# Altium footprint library Semi-ATE.PcbLib: 155 footprints (part 8 of 10)
Each footprint in its own frame and in the unit in brackets; x right, y up, seen from the top. Pads: shape width x height; smd on the part's side, far side on the other; paste and mask are expansions set on the pad; w line width, h text height; cw(c..) or ccw(c..) is an arc to the next point about the centre after c.
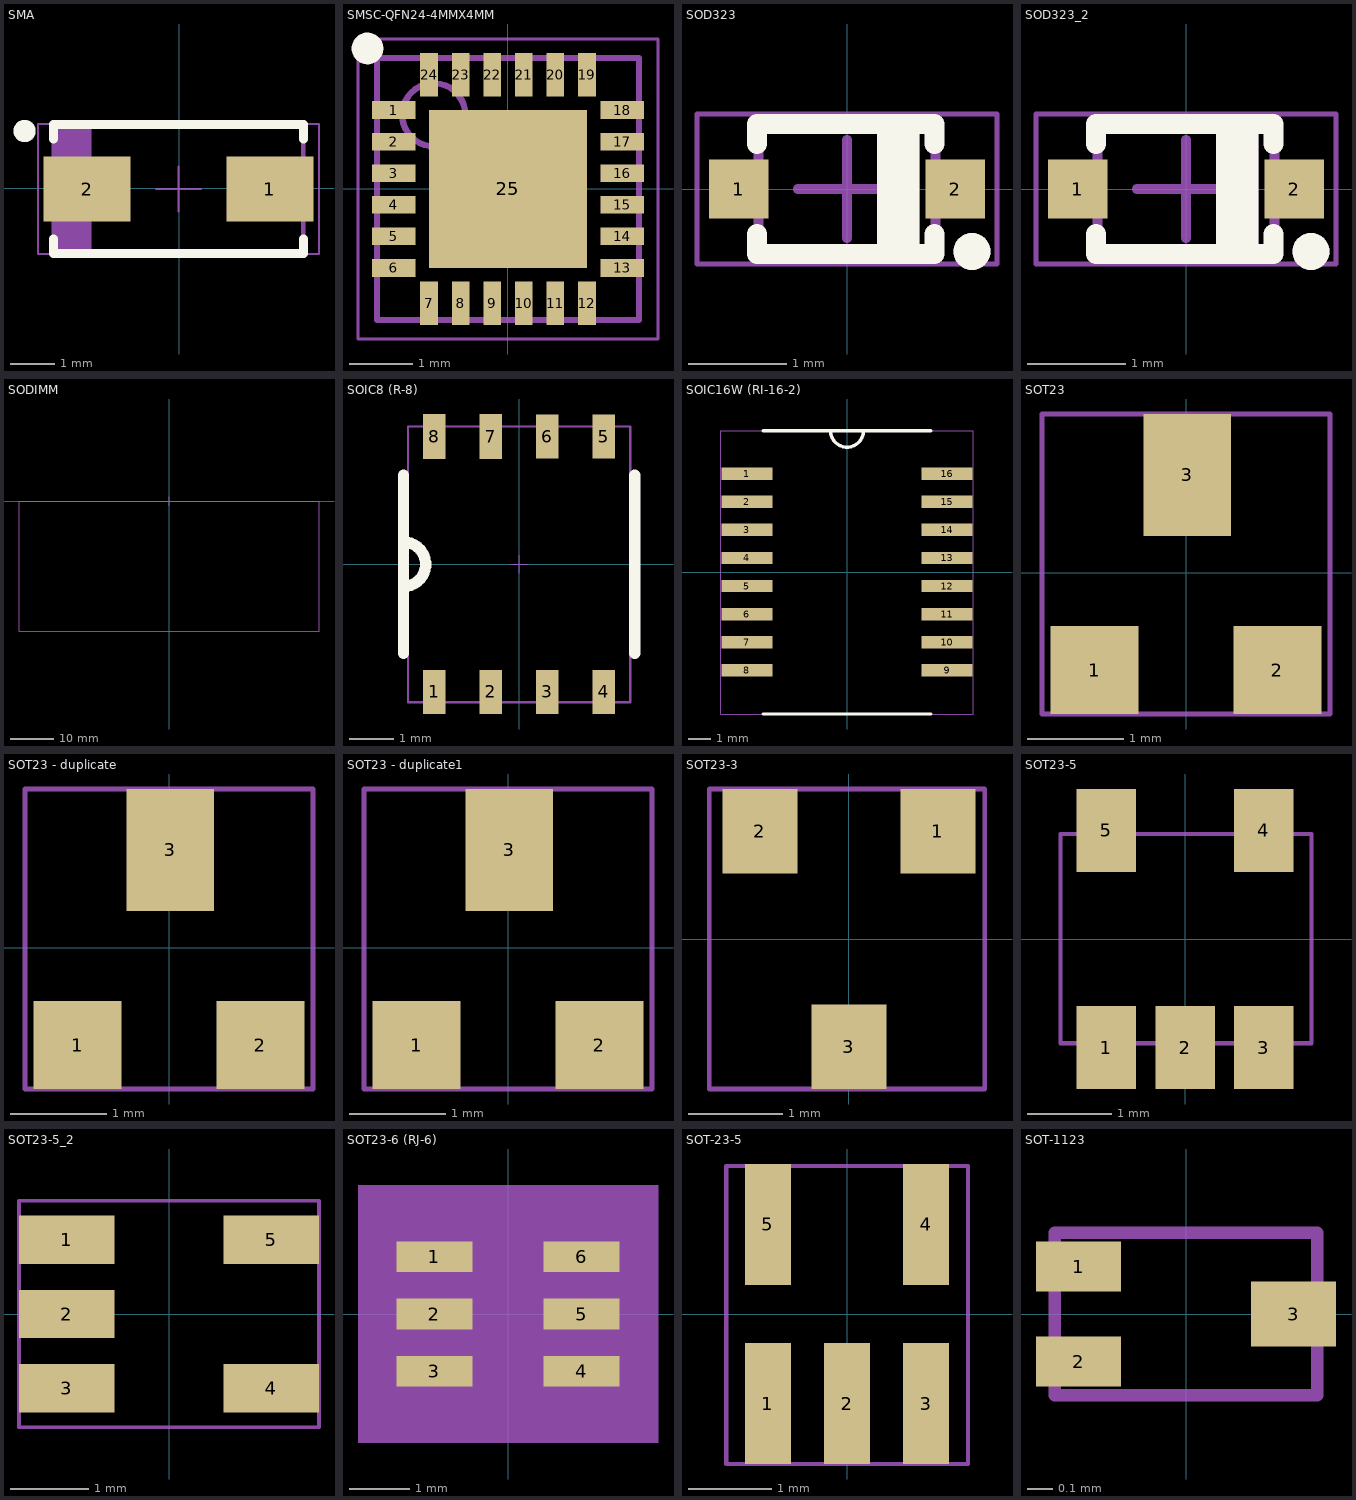
[diagram p7: the footprints below, top view; thin cyan lines are the x and y axes]

## SMA [mm]
height 2.62
pads (2):
  rect 1.95x1.45 smd: 1(2.037,-0.013) 2(-2.063,-0.013)
Top Overlay:
  circle w0.25: c-3.463,1.287 r0.125
  lines w0.2: -2.813,-1.138 -2.813,-1.463 2.787,-1.463 2.787,-1.138 ; -2.813,1.112 -2.813,1.437 2.787,1.437 2.787,1.112
Top Designator:
  text ".Designator" at -7.893,-0.521 h1.52
Top 3D Body:
  lines w0.05: -3.163,-1.473 -3.163,1.447 3.137,1.447 3.137,-1.473 -3.163,-1.473
Bottom 3D Body:
  lines w0.1: -2.708,-1.473 -2.708,1.447 ; -2.608,-1.473 -2.608,1.447 ; -2.508,-1.473 -2.508,1.447 ; -2.408,-1.473 -2.408,1.447 ; -2.308,-1.473 -2.308,1.447 ; -2.208,-1.473 -2.208,1.447 ; -2.108,-1.473 -2.108,1.447 ; -2.008,-1.473 -2.008,1.447 ; -2.808,-1.473 2.782,-1.473 2.782,1.447 -2.808,1.447 -2.808,-1.473
Bottom Gold Plating:
  lines w0.05: -0.513,-0.013 0.487,-0.013 ; -0.013,-0.513 -0.013,0.487
3D body: height 2.4, standoff 0, extent -2.808,-1.473 2.782,1.447

## SMSC-QFN24-4MMX4MM [mm] "QFN, 24-Leads, Body 4.00x4.00mm, Pitch 0.50mm, Thermal Pad 2.50x2.50mm, IPC High Density"
height 1
pads (25):
  rect 0.69x0.28 smd: 1(-1.81,1.25) 2(-1.81,0.75) 3(-1.81,0.25) 4(-1.81,-0.25) 5(-1.81,-0.75) 6(-1.81,-1.25) 13(1.81,-1.25) 14(1.81,-0.75) 15(1.81,-0.25) 16(1.81,0.25) 17(1.81,0.75) 18(1.81,1.25)
  rect 0.28x0.69 smd: 7(-1.25,-1.81) 8(-0.75,-1.81) 9(-0.25,-1.81) 10(0.25,-1.81) 11(0.75,-1.81) 12(1.25,-1.81) 19(1.25,1.81) 20(0.75,1.81) 21(0.25,1.81) 22(-0.25,1.81) 23(-0.75,1.81) 24(-1.25,1.81)
  rect 2.5x2.5 smd: 25(0,0)
Top Overlay:
  circle w0.25: c-2.225,2.225 r0.125
Top Designator:
  text ".Designator" at -7.655,-0.47 h1.52
Top 3D Body:
  lines w0.05: -2.375,-2.375 2.375,-2.375 2.375,2.375 -2.375,2.375 -2.375,-2.375
Bottom 3D Body:
  circle w0.1: c-1.175,1.175 r0.5
  lines w0.1: -2.075,-2.075 2.075,-2.075 2.075,2.075 -2.075,2.075 -2.075,-2.075
Bottom Gold Plating:
  lines w0.1: -0.5,0 0.5,0 ; 0,-0.5 0,0.5
3D body: height 1, standoff 0, extent -2.075,-2.075 2.075,2.075

## SOD323 [mm]
height 10
pads (2):
  rect 0.6x0.6 smd: 1(-1.1,0) 2(1.1,0)
Top Overlay:
  circle w0.254: c1.27,-0.635 r0.06
  rectangle: 0.305,-0.635 0.737,0.726
  lines w0.2: -0.914,-0.457 -0.914,-0.66 0.889,-0.66 0.889,-0.457 ; -0.914,0.457 -0.914,0.66 0.889,0.66 0.889,0.457
Top Designator:
  text ".Designator" at -7.618,-0.525 h1.52
Top 3D Body:
  lines w0.05: -1.524,-0.762 1.524,-0.762 1.524,0.762 -1.524,0.762 -1.524,-0.762
Bottom 3D Body:
  circle w0.254: c1.27,-0.635 r0.06
  rectangle: 0.305,-0.686 0.737,0.675
  lines w0.1: -0.9,-0.229 -1.321,-0.229 -1.321,0.229 -0.9,0.229 ; 0.9,-0.229 1.321,-0.229 1.321,0.229 0.9,0.229 ; -0.9,-0.675 0.9,-0.675 0.9,0.675 -0.9,0.675 -0.9,-0.675
Bottom Gold Plating:
  lines w0.1: -0.5,0 0.5,0 ; 0,-0.5 0,0.5
3D body: height 1.1, standoff 0, extent -0.9,-0.675 0.9,0.675

## SOD323_2 [mm]
pads (2):
  rect 0.6x0.6 smd: 1(-1.1,0) 2(1.1,0)
Top Overlay:
  circle w0.254: c1.27,-0.635 r0.06
  rectangle: 0.305,-0.635 0.737,0.726
  lines w0.2: -0.914,-0.457 -0.914,-0.66 0.889,-0.66 0.889,-0.457 ; -0.914,0.457 -0.914,0.66 0.889,0.66 0.889,0.457
Top Designator:
  text ".Designator" at -7.618,-0.525 h1.52
Top 3D Body:
  lines w0.05: -1.524,-0.762 1.524,-0.762 1.524,0.762 -1.524,0.762 -1.524,-0.762
Bottom 3D Body:
  circle w0.254: c1.27,-0.635 r0.06
  rectangle: 0.305,-0.686 0.737,0.675
  lines w0.1: -0.9,-0.229 -1.321,-0.229 -1.321,0.229 -0.9,0.229 ; 0.9,-0.229 1.321,-0.229 1.321,0.229 0.9,0.229 ; -0.9,-0.675 0.9,-0.675 0.9,0.675 -0.9,0.675 -0.9,-0.675
Bottom Gold Plating:
  lines w0.1: -0.5,0 0.5,0 ; 0,-0.5 0,0.5
3D body: height 1.1, standoff 0, extent -0.9,-0.675 0.9,0.675

## SODIMM [mm] "Generic 260 Pin SODIMM"
Top Designator:
  text ".Designator" at -7.618,-15.141 h1.52
Bottom 3D Body:
  lines w0.254: -34.893,-30.19 -34.893,0 34.893,0 34.893,-30.19 -34.893,-30.19
Bottom Gold Plating:
  lines w0.1: -1,0 1,0 ; 0,-1 0,1
3D body "260PinSODIMM.STEP": height 7.43, standoff 4.93, extent -34.8,-30.094 34.8,-0.094

## SOIC8 (R-8) [mil] "Generic 8 lead SOIC Narrow Body"
height 69
pads (8):
  rect 20x39 smd: 1(-75,-113) 2(-25,-113) 3(25,-113) 4(75,-113) 5(75,113) 6(25,113)
  rect 20x40 smd: 7(-25,113) 8(-75,113)
Top Overlay:
  lines w10: -102.36,-78.74 -102.36,78.74 ; -102.36,-19.68 ccw(c-102.36,0) -102.36,19.68 ; 102.36,-78.74 102.36,78.74
Top Designator:
  text ".Designator" at -299.9,-19.74 h60
Top 3D Body:
  lines w1.97: -98.42,-122.04 98.43,-122.04 98.43,122.06 -98.42,122.06 -98.42,-122.04
Bottom Gold Plating:
  lines w0.51: -7.87,0 7.87,0 ; 0,-7.87 0,7.87
3D body "SOIC8N.step": height 68.9, standoff 0, extent -98.42,-122.04 98.43,122.06

## SOIC16W (RI-16-2) [mil]
height 98.43
pads (16):
  rect 90.5x22 smd: 1(-178.25,175) 2(-178.25,125) 3(-178.25,75) 4(-178.25,25) 5(-178.25,-25) 6(-178.25,-75) 7(-178.25,-125) 8(-178.25,-175) 9(178.25,-175) 10(178.25,-125) 11(178.25,-75) 12(178.25,-25) 13(178.25,25) 14(178.25,75) 15(178.25,125) 16(178.25,175)
Top Overlay:
  lines w6: -149.5,-252.95 149.5,-252.95 ; -149.5,251.97 149.5,251.97 ; -29.53,251.97 ccw(c0,251.97) 29.53,251.97
Top Designator:
  text ".Designator" at -299.9,-20.49 h60
Top 3D Body:
  lines w1.97: -225,-252.95 225,-252.95 225,251.97 -225,251.97 -225,-252.95
3D body "SOIC16W(RI-16-2).STEP": height 114.17, standoff 0, extent -206.88,-252.95 206.9,252.95

## SOT23 [mil]
pads (3):
  rect 36x36 smd: 1(-37.5,-40) 2(37.5,-40)
  rect 36x50 smd: 3(0.5,40)
Top Designator:
  text ".Designator" at -299.9,-16.49 h60
Top 3D Body:
  lines w1.97: -59.06,-58 -59.06,65 59.06,65 59.06,-58 -59.06,-58
3D body: height 43.31, standoff 0, extent -59.06,-27.56 59.06,27.56

## SOT23 - duplicate [mil]
pads (3):
  rect 36x36 smd: 1(-37.5,-40) 2(37.5,-40)
  rect 36x50 smd: 3(0.5,40)
Top Designator:
  text ".Designator" at -299.9,-16.49 h60
Top 3D Body:
  lines w1.97: -59.06,-58 59.06,-58 59.06,65 -59.06,65 -59.06,-58
3D body: height 43.31, standoff 0, extent -59.06,-27.56 59.06,27.56

## SOT23 - duplicate1 [mil]
pads (3):
  rect 36x36 smd: 1(-37.5,-40) 2(37.5,-40)
  rect 36x50 smd: 3(0.5,40)
Top Designator:
  text ".Designator" at -299.9,-16.49 h60
Top 3D Body:
  lines w1.97: -59.06,-58 59.06,-58 59.06,65 -59.06,65 -59.06,-58
3D body: height 43.31, standoff 0, extent -59.06,-27.56 59.06,27.56

## SOT23-3 [mm]
pads (3):
  rect 0.8x0.9 smd mask+0.1: 1(0.95,1.15) 2(-0.95,1.15) 3(0,-1.15)
Top Designator:
  text ".Designator" at -7.637,-0.508 h1.52
Top 3D Body:
  lines w0.05: -1.49,-1.6 -1.49,1.6 1.45,1.6 1.45,-1.6 -1.49,-1.6
3D body "SOT23-3.step": height 1.3, standoff 0, extent -1.45,-1.4 1.45,1.4

## SOT23-5 [mil] "SOT 23 5 lead"
height 57
pads (5):
  rect 28x39 smd: 1(-37,-51) 2(0,-51) 3(37,-51) 4(37,51) 5(-37,51)
Top Designator:
  text ".Designator" at -299.5,-19.99 h60
Top 3D Body:
  lines w1.97: -58.65,-49.03 59.46,-49.03 59.46,49.39 -58.65,49.39 -58.65,-49.03
3D body "SOT23-5.step": height 41.65, standoff -1.65, extent -58.65,-49.03 59.46,49.39

## SOT23-5_2 [mm]
pads (5):
  rect 1.22x0.62 smd: 1(-1.31,0.95) 2(-1.31,0) 3(-1.31,-0.95) 4(1.31,-0.95) 5(1.31,0.95)
Top Designator:
  text ".Designator" at -7.618,-0.508 h1.52
Top 3D Body:
  lines w0.05: -1.92,-1.45 -1.92,1.45 1.92,1.45 1.92,-1.45 -1.92,-1.45
3D body: height 1, standoff 0.1, extent -0.875,-1.45 0.875,1.45

## SOT23-6 (RJ-6) [mil]
pads (6):
  rect 49.56x20 smd paste+0 mask+0: 1(-48,37.4) 2(-48,0) 3(-48,-37.4) 4(48,-37.4) 5(48,0) 6(48,37.4)
Top Overlay:
  text "." at -55.12,59.06 h118.11
Top Designator:
  text ".Designator" at -299.9,-19.99 h60
Top 3D Body:
  region: 97.78,-84 -97.78,-84 -97.78,84 97.78,84
3D body: height 10, standoff 0, extent 0,0 10,10
3D body "RJ_6_ADI.step": height 57.09, standoff 0, extent -59.01,-59.01 59.02,59.02

## SOT-23-5 [mm] "SOT25, SOT753, MO-178AA, SC-74A, SMT5; 5 Leads; Pitch 0.95mm; Body 3.1 x 3 mm, inc. leads (LxW max)"
height 1.25
pads (5):
  rect 0.55x1.45 smd mask+0.1: 1(-0.95,-1.075) 2(0,-1.075) 3(0.95,-1.075)
  rect 0.55x1.45 smd: 4(0.95,1.075) 5(-0.95,1.075)
Top Designator:
  text ".Designator" at -7.617,-0.507 h1.52
Top 3D Body:
  lines w0.05: -1.45,-1.8 -1.45,1.778 1.45,1.778 1.45,-1.8 -1.45,-1.8
3D body "SOT23-5-2.STEP": height 1.45, standoff 0, extent -1.45,-1.4 1.45,1.4

## SOT-1123 [mm]
pads (3):
  rect 0.34x0.2 smd: 1(-0.43,0.19) 2(-0.43,-0.19)
  rect 0.34x0.26 smd: 3(0.43,0)
Top Designator:
  text ".Designator" at -7.618,-0.508 h1.52
Top 3D Body:
  lines w0.05: 0.525,-0.325 0.525,0.325 ; 0.525,-0.325 0.525,-0.325 ; 0.525,-0.325 -0.525,-0.325 -0.525,0.325 0.525,0.325 ; 0.525,0.325 0.525,0.325
3D body "SOT-1123.STEP": height 0.4, standoff 0, extent -0.525,-0.325 0.525,0.325